# Altium footprint library AltiumLibrary.PcbLib: 122 footprints (part 4 of 8)
Each footprint in its own frame and in the unit in brackets; x right, y up, seen from the top. Pads: shape width x height; smd on the part's side, far side on the other; paste and mask are expansions set on the pad; w line width, h text height; cw(c..) or ccw(c..) is an arc to the next point about the centre after c.
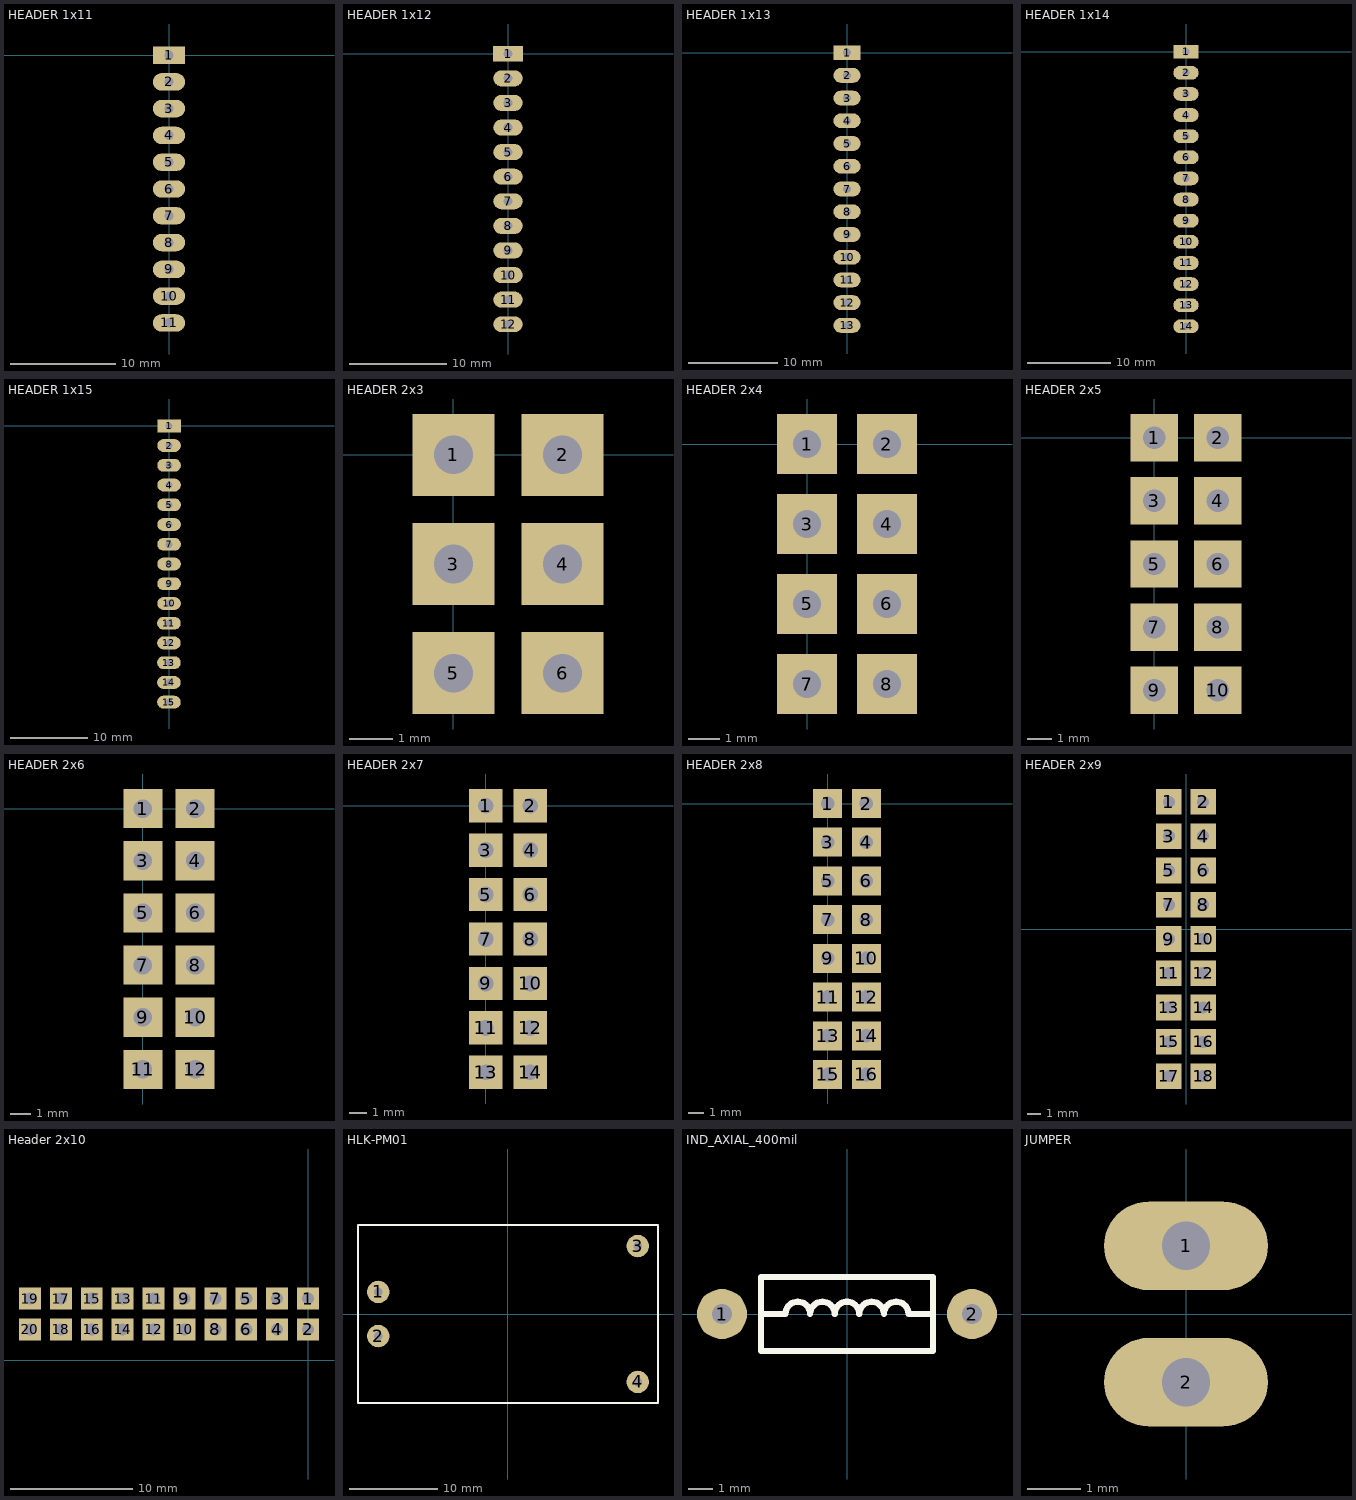
[diagram p3: the footprints below, top view; thin cyan lines are the x and y axes]

## HEADER 1x11 [mil]
pads (11):
  rect 120x65 hole 35.43: 1(0,0)
  oval 120x65 hole 35.43: 2(0,-100) 3(0,-200) 4(0,-300) 5(0,-400) 6(0,-500) 7(0,-600) 8(0,-700) 9(0,-800) 10(0,-900) 11(0,-1000)
3D body "User Library-Header_Male_2Pin.STEP": height 336.22, standoff -118.11, extent -49.01,-1049.99 49.01,-849.99
3D body "User Library-Header_Male_4Pin.STEP": height 336.22, standoff -118.11, extent -49.01,-350 49.02,50
3D body "User Library-Header_Male_5Pin.STEP": height 336.22, standoff -118.11, extent -49.01,-850 49.02,-350

## HEADER 1x12 [mil]
pads (12):
  rect 120x65 hole 35.43: 1(0,0)
  oval 120x65 hole 35.43: 2(0,-100) 3(0,-200) 4(0,-300) 5(0,-400) 6(0,-500) 7(0,-600) 8(0,-700) 9(0,-800) 10(0,-900) 11(0,-1000) 12(0,-1100)
3D body "User Library-Header_Male_10Pin.STEP": height 336.22, standoff -118.11, extent -50,-950 48.03,50
3D body "User Library-Header_Male_2Pin.STEP": height 336.22, standoff -118.11, extent -50,-1150 48.03,-950

## HEADER 1x13 [mil]
pads (13):
  rect 120x65 hole 35.43: 1(0,0)
  oval 120x65 hole 35.43: 2(0,-100) 3(0,-200) 4(0,-300) 5(0,-400) 6(0,-500) 7(0,-600) 8(0,-700) 9(0,-800) 10(0,-900) 11(0,-1000) 12(0,-1100) 13(0,-1200)
3D body "User Library-Header_Male_10Pin.STEP": height 336.22, standoff -118.11, extent -50,-950 48.03,50
3D body "User Library-Header_Male_3Pin.STEP": height 336.22, standoff -118.11, extent -49.01,-1249.99 49.01,-949.99

## HEADER 1x14 [mil]
pads (14):
  rect 120x65 hole 35.43: 1(0,0)
  oval 120x65 hole 35.43: 2(0,-100) 3(0,-200) 4(0,-300) 5(0,-400) 6(0,-500) 7(0,-600) 8(0,-700) 9(0,-800) 10(0,-900) 11(0,-1000) 12(0,-1100) 13(0,-1200) 14(0,-1300)
3D body "User Library-Header_Male_4Pin.STEP": height 336.22, standoff -118.11, extent -50,-1350 48.03,-950
3D body "User Library-Header_Male_10Pin.STEP": height 336.22, standoff -118.11, extent -50,-950 48.03,50

## HEADER 1x15 [mil]
pads (15):
  rect 120x65 hole 35.43: 1(0,0)
  oval 120x65 hole 35.43: 2(0,-100) 3(0,-200) 4(0,-300) 5(0,-400) 6(0,-500) 7(0,-600) 8(0,-700) 9(0,-800) 10(0,-900) 11(-1,-1000) 12(-1,-1100) 13(-1,-1200) 14(-1,-1300) 15(-1,-1400)
3D body "User Library-Header_Male_10Pin.STEP": height 336.22, standoff -118.11, extent -50,-950 48.03,50
3D body "User Library-Header_Male_5Pin.STEP": height 336.22, standoff -118.11, extent -50.01,-1450 48.02,-950

## HEADER 2x3 [mm]
pads (6):
  rect 1.905x1.905 hole 0.9: 1(0,0) 2(2.54,0) 3(0,-2.54) 4(2.54,-2.54) 5(0,-5.08) 6(2.54,-5.08)
3D body "User Library-Header_Male_3Pin.STEP": height 8.54, standoff -3, extent -1.245,-6.35 1.245,1.27
3D body "User Library-Header_Male_3Pin.STEP": height 8.54, standoff -3, extent 1.295,-6.35 3.785,1.27

## HEADER 2x4 [mm]
pads (8):
  rect 1.905x1.905 hole 0.9: 1(0,0) 2(2.54,0) 3(0,-2.54) 4(2.54,-2.54) 5(0,-5.08) 6(2.54,-5.08) 7(0,-7.62) 8(2.54,-7.62)
3D body "User Library-Header_Male_4Pin.STEP": height 8.54, standoff -3, extent -1.245,-8.89 1.245,1.27
3D body "User Library-Header_Male_4Pin.STEP": height 8.54, standoff -3, extent 1.295,-8.89 3.785,1.27

## HEADER 2x5 [mm]
pads (10):
  rect 1.905x1.905 hole 0.9: 1(0,0) 2(2.54,0) 3(0,-2.54) 4(2.54,-2.54) 5(0,-5.08) 6(2.54,-5.08) 7(0,-7.62) 8(2.54,-7.62) 9(0,-10.16) 10(2.54,-10.16)
3D body "User Library-Header_Male_5Pin.STEP": height 8.54, standoff -3, extent 1.295,-11.43 3.785,1.27
3D body "User Library-Header_Male_5Pin.STEP": height 8.54, standoff -3, extent -1.245,-11.43 1.245,1.27

## HEADER 2x6 [mm]
pads (12):
  rect 1.905x1.905 hole 0.9: 1(0,0) 2(2.54,0) 3(0,-2.54) 4(2.54,-2.54) 5(0,-5.08) 6(2.54,-5.08) 7(0,-7.62) 8(2.54,-7.62) 9(0,-10.16) 10(2.54,-10.16) 11(0,-12.7) 12(2.54,-12.7)
3D body "User Library-Header_Male_2Pin.STEP": height 8.54, standoff -3, extent 1.295,-13.97 3.785,-8.89
3D body "User Library-Header_Male_2Pin.STEP": height 8.54, standoff -3, extent 1.295,-8.89 3.785,-3.81
3D body "User Library-Header_Male_2Pin.STEP": height 8.54, standoff -3, extent 1.295,-3.81 3.785,1.27
3D body "User Library-Header_Male_2Pin.STEP": height 8.54, standoff -3, extent -1.245,-3.81 1.245,1.27
3D body "User Library-Header_Male_2Pin.STEP": height 8.54, standoff -3, extent -1.245,-8.89 1.245,-3.81
3D body "User Library-Header_Male_2Pin.STEP": height 8.54, standoff -3, extent -1.245,-13.97 1.245,-8.89

## HEADER 2x7 [mm]
pads (14):
  rect 1.905x1.905 hole 0.9: 1(0,0) 2(2.54,0) 3(0,-2.54) 4(2.54,-2.54) 5(0,-5.08) 6(2.54,-5.08) 7(0,-7.62) 8(2.54,-7.62) 9(0,-10.16) 10(2.54,-10.16) 11(0,-12.7) 12(2.54,-12.7) 13(0,-15.24) 14(2.54,-15.24)
3D body "User Library-Header_Male_3Pin.STEP": height 8.54, standoff -3, extent 1.295,-6.35 3.785,1.27
3D body "User Library-Header_Male_4Pin.STEP": height 8.54, standoff -3, extent 1.295,-16.51 3.785,-6.35
3D body "User Library-Header_Male_4Pin.STEP": height 8.54, standoff -3, extent -1.245,-16.51 1.245,-6.35
3D body "User Library-Header_Male_3Pin.STEP": height 8.54, standoff -3, extent -1.245,-6.35 1.245,1.27

## HEADER 2x8 [mm]
pads (16):
  rect 1.905x1.905 hole 0.9: 1(0,0) 2(2.54,0) 3(0,-2.54) 4(2.54,-2.54) 5(0,-5.08) 6(2.54,-5.08) 7(0,-7.62) 8(2.54,-7.62) 9(0,-10.16) 10(2.54,-10.16) 11(0,-12.7) 12(2.54,-12.7) 13(0,-15.24) 14(2.54,-15.24) 15(0,-17.78) 16(2.54,-17.78)
3D body "User Library-Header_Male_8Pin.STEP": height 8.54, standoff -3, extent 1.32,-19.05 3.81,1.27
3D body "User Library-Header_Male_8Pin.STEP": height 8.54, standoff -3, extent -1.22,-19.05 1.27,1.27

## HEADER 2x9 [mil]
pads (18):
  rect 75x75 hole 35.43: 1(-50,372) 2(50,372) 3(-50,272) 4(50,272) 5(-50,172) 6(50,172) 7(-50,72) 8(50,72) 9(-50,-28) 10(50,-28) 11(-50,-128) 12(50,-128) 13(-50,-228) 14(50,-228) 15(-50,-328) 16(50,-328) 17(-50,-428) 18(50,-428)
3D body "User Library-Header_Male_5Pin.STEP": height 336.22, standoff -118.11, extent -99.01,-477.99 -0.99,22.01
3D body "User Library-Header_Male_5Pin.STEP": height 336.22, standoff -118.11, extent 0.99,-477.99 99.01,22.01
3D body "User Library-Header_Male_4Pin.STEP": height 336.22, standoff -118.11, extent -99.01,22 -0.98,422
3D body "User Library-Header_Male_4Pin.STEP": height 336.22, standoff -118.11, extent 0.99,22.01 99.01,422.01

## Header 2x10 [mm]
pads (20):
  rect 1.8x1.8 hole 1: 1(0,5.08) 2(0,2.54) 3(-2.54,5.08) 4(-2.54,2.54) 5(-5.08,5.08) 6(-5.08,2.54) 7(-7.62,5.08) 8(-7.62,2.54) 9(-10.16,5.08) 10(-10.16,2.54) 11(-12.7,5.08) 12(-12.7,2.54) 13(-15.24,5.08) 14(-15.24,2.54) 15(-17.78,5.08) 16(-17.78,2.54) 17(-20.32,5.08) 18(-20.32,2.54) 19(-22.86,5.08) 20(-22.86,2.54)
3D body "DS1021-2x5S61.stp": height 8.6, standoff -3, extent -24.13,1.27 -11.43,6.35
3D body "DS1021-2x5S61.stp": height 8.6, standoff -3, extent -11.43,1.27 1.27,6.35

## HLK-PM01 [mm]
pads (4):
  round 2.54 hole 1 unplated: 1(-14.7,2.5) 2(-14.7,-2.5) 3(14.7,7.7) 4(14.7,-7.7)
Top Overlay:
  lines w0.254: -17,-10.1 17,-10.1 17,10.1 -17,10.1 -17,-10.1
3D body "User Library-HLK-PM01.step": height 15.1, standoff -5, extent -16.9,-10 17.1,10.2

## IND_AXIAL_400mil [mil]
pads (2):
  round 80 hole 31.5: 1(-200,0) 2(200,0)
Top Overlay:
  lines w10: -137.8,0 -98.43,0 cw(c-78.74,0) -59.06,0 cw(c-39.37,0) -19.68,0 cw(c0,0) 19.68,0 cw(c39.37,0) 59.06,0 cw(c78.74,0) 98.43,0 137.8,0 ; -137.8,-59.06 -137.8,59.06 137.8,59.06 137.8,-59.06 -137.8,-59.06

## JUMPER [mil]
pads (2):
  oval 120x65 hole 35.43: 1(0,50) 2(0,-50)
3D body "User Library-Header_Male_2Pin.STEP": height 336.22, standoff -118.11, extent -49.01,-99.99 49.01,100.01
3D body "Pin header jumper.stp": height 350, standoff 113.78, extent -49.01,-96.84 49.41,100.01